# Altium footprint library negm_2.PcbLib: 5 footprints
Each footprint in its own frame and in the unit in brackets; x right, y up, seen from the top. Pads: shape width x height; smd on the part's side, far side on the other; paste and mask are expansions set on the pad; w line width, h text height; cw(c..) or ccw(c..) is an arc to the next point about the centre after c.
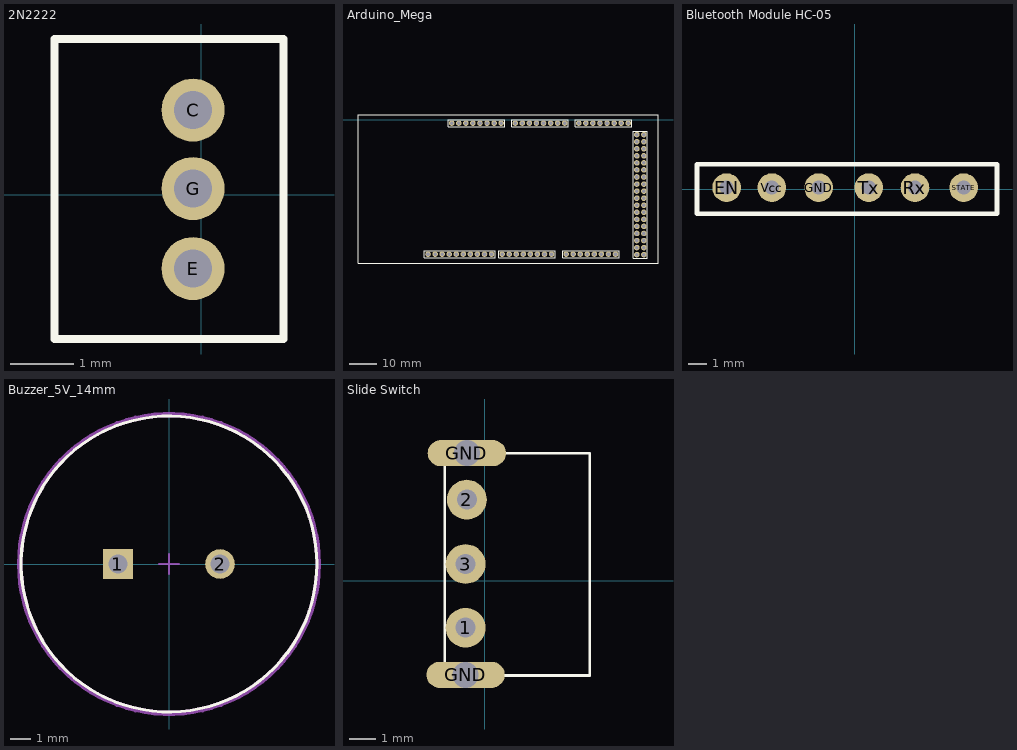
[diagram p0: the footprints below, top view; thin cyan lines are the x and y axes]

## 2N2222 [mm]
pads (3):
  round 1 hole 0.6: C(-0.127,1.346) E(-0.127,-1.168) G(-0.127,0.102)
Top Overlay:
  lines w0.125: -2.323,-2.286 1.307,-2.286 1.307,2.474 -2.323,2.474 -2.323,-2.286
3D body "2N2222.STEP": height 4.84, standoff -3.87, extent -2.323,-2.286 1.307,2.474

## Arduino_Mega [mm] "Arduino_Mega"
pads (86):
  round 2 hole 1.3: 3.3V(644.601,-1.143) 5V(647.141,-1.143) 5V_DOWN(703.58,-48.463) 5V_DOWN(706.12,-48.463) 22(706.12,-45.923) 23(703.58,-45.923) 24(706.12,-43.383) 25(703.58,-43.383) 26(706.12,-40.843) 27(703.58,-40.843) 28(706.12,-38.303) 29(703.58,-38.303) 30(706.12,-35.763) 31(703.58,-35.763) 32(706.12,-33.223) 33(703.58,-33.223) 34(706.12,-30.683) 35(703.58,-30.683) 36(706.12,-28.143) 37(703.58,-28.143) 38(706.12,-25.603) 39(703.58,-25.603) 40(706.12,-23.063) 41(703.58,-23.063) 42(706.12,-20.523) 43(703.58,-20.523) 44(706.12,-17.983) 45(703.58,-17.983) 46(706.12,-15.443) 47(703.58,-15.443) 48(706.12,-12.903) 49(703.58,-12.903) 50(706.12,-10.363) 51(703.58,-10.363) 52(706.12,-7.823) 53(703.58,-7.823) A_0(659.841,-1.143) A_1(662.381,-1.143) A_2(664.921,-1.143) A_3(667.461,-1.143) A_4(670.001,-1.143) A_5(672.541,-1.143) A_6(675.081,-1.143) A_7(677.621,-1.143) A_8(682.701,-1.143) A_9(685.241,-1.143) A_10(687.781,-1.143) A_11(690.321,-1.143) A_12(692.861,-1.143) A_13(695.401,-1.143) A_14(697.941,-1.143) A_15(700.481,-1.143) GND_DOWN(703.58,-5.283) GND_DOWN(706.12,-5.283) GND_POWER(649.681,-1.143) GND_POWER(652.221,-1.143) GND_PWM(636.067,-48.285) HOLD(636.981,-1.143) PWM_2(667.817,-48.285) PWM_3(665.277,-48.285) PWM_4(662.737,-48.285) PWM_5(660.197,-48.285) PWM_6(657.657,-48.285) PWM_7(655.117,-48.285) PWM_8(651.307,-48.285) PWM_9(648.767,-48.285) PWM_10(646.227,-48.285) PWM_11(643.687,-48.285) PWM_12(641.147,-48.285) PWM_13(638.607,-48.285) REF(633.527,-48.285) REF_I/O(639.521,-1.143) RST(642.061,-1.143) Rx_0(672.897,-48.285) Rx_15(680.669,-48.285) Rx_17(685.749,-48.285) Rx_19(690.829,-48.285) SCL(628.447,-48.285) SCL_21(695.909,-48.285) SDA(630.987,-48.285) SDA_20(693.369,-48.285) Tx_1(670.357,-48.285) Tx_14(678.129,-48.285) Tx_16(683.209,-48.285) Tx_18(688.289,-48.285) Vin(654.761,-1.143)
Top Overlay:
  lines w0.254: 603.25,-51.511 711.2,-51.511 711.2,1.829 603.25,1.829 603.25,-51.511 ; 627.177,-49.555 652.577,-49.555 652.577,-47.015 627.177,-47.015 627.177,-49.555 ; 635.711,-2.413 656.031,-2.413 656.031,0.127 635.711,0.127 635.711,-2.413 ; 653.847,-49.555 674.167,-49.555 674.167,-47.015 653.847,-47.015 653.847,-49.555 ; 658.571,-2.413 678.891,-2.413 678.891,0.127 658.571,0.127 658.571,-2.413 ; 676.859,-49.555 697.179,-49.555 697.179,-47.015 676.859,-47.015 676.859,-49.555 ; 681.431,-2.413 701.751,-2.413 701.751,0.127 681.431,0.127 681.431,-2.413 ; 702.31,-49.733 707.39,-49.733 707.39,-4.013 702.31,-4.013 702.31,-49.733
Design Notes:
  text ".Designator" at 610.295,-30.455 h5
3D body "8_pin_header_12.4_.stp": height 8.62, standoff -3.78, extent 681.231,-2.392 701.551,0.106
3D body "8_pin_header_12.4_.stp": height 8.62, standoff -3.78, extent 676.659,-49.514 696.979,-47.015
3D body "8_pin_header_12.4_.stp": height 8.62, standoff -3.78, extent 658.371,-2.392 678.691,0.106
3D body "8_pin_header_12.4_.stp": height 8.62, standoff -3.78, extent 635.511,-2.392 655.831,0.106
3D body "8_pin_header_12.4_.stp": height 8.62, standoff -3.78, extent 653.647,-49.535 673.967,-47.036
3D body "10-pin_header.stp": height 8.62, standoff -3.78, extent 626.977,-49.535 652.377,-47.036
3D body "ARDUINO_MEGA_2560.STEP": height 15.3, standoff 0.05, extent 603.098,-51.257 711.048,2.083
3D body "18x2-pin_header_.stp": height 8.5, standoff -3, extent 702.31,-49.733 707.39,-4.013

## Bluetooth Module HC-05 [mil] "Voltage: 3.6 V-6 V connected to the VCC pin / Communication leads are working with voltage 3.3 V (tolerate 5 V) / Current consumption: approx. 50 mA / Class 2 – maximum transmitter power + 4 dBm / Range: up to 10 m / The password for pairing: 1234 / Standard: Bluetooth 2.0 + EDR / The SPP profile with possibility to configure via AT commands / Communication: UART (RX, TX) / Small dimensions: 39 x 16 mm"
pads (6):
  round 60 hole 30: EN(-269,4) GND(-76,4) Rx(126,4) STATE(228,4) Tx(29,4) Vcc(-174,4)
Top Overlay:
  lines w10: -331,-51 298,-51 298,53 -331,53 -331,-51
mechanical_29:
  text ".Designator" at -328,73.99 h60
3D body "User Library-HC05-Bluetooth.STEP": height 1496.22, standoff 78.59, extent -331.65,-20.52 298.96,53.06
3D body "User Library-Header_Male_6Pin.STEP": height 336.22, standoff -118.11, extent -320,-45.02 280,53.02

## Buzzer_5V_14mm [mm] "FP-PS1440P02BT-MFG"
pads (2):
  rect 1.45x1.45 hole 0.95 paste-2539.97 mask+0: 1(-2.5,0)
  round 1.45 hole 0.95 paste-2539.97 mask+0: 2(2.5,0)
Top Overlay:
  circle w0.15: c0,0 r7.25
Top Assembly:
  text ".Designator" at 0,-0.001 h1
mechanical_29:
  circle w0.15: c0,0 r7.25
Top Courtyard:
  lines w0.2: -7.35,0 cw(c0,0) 7.35,0 cw(c0,0) -7.35,0
Top Component Center:
  lines w0.1: -0.5,0 0.5,0 ; 0,-0.5 0,0.5
3D body "Speak_TDK_Corporation_PS1440P02BT_eec.STEP": height 0.25, standoff 0, extent -7.35,-7.35 7.35,7.35

## Slide Switch [mil] "Slide Switch Right-Angle SPDT 50V 0.5A Plugin for PCB"
pads (5):
  round 60 hole 30: 1(-29,-71) 2(-27,122) 3(-29,25)
  oval 118.11x39.37 hole 39.37: GND(-29,-142) GND(-27,192)
Top Overlay:
  lines w3.94: -60.23,-143 158,-143 158,192 -60.23,192 -60.23,-143
3D body "Slide Switch Right-Angle .STEP": height 157.98, standoff -109.74, extent -58.53,-142.32 158.01,192.33